# Altium footprint library Standard2.PcbLib: 423 footprints (part 14 of 27)
Each footprint in its own frame and in the unit in brackets; x right, y up, seen from the top. Pads: shape width x height; smd on the part's side, far side on the other; paste and mask are expansions set on the pad; w line width, h text height; cw(c..) or ccw(c..) is an arc to the next point about the centre after c.
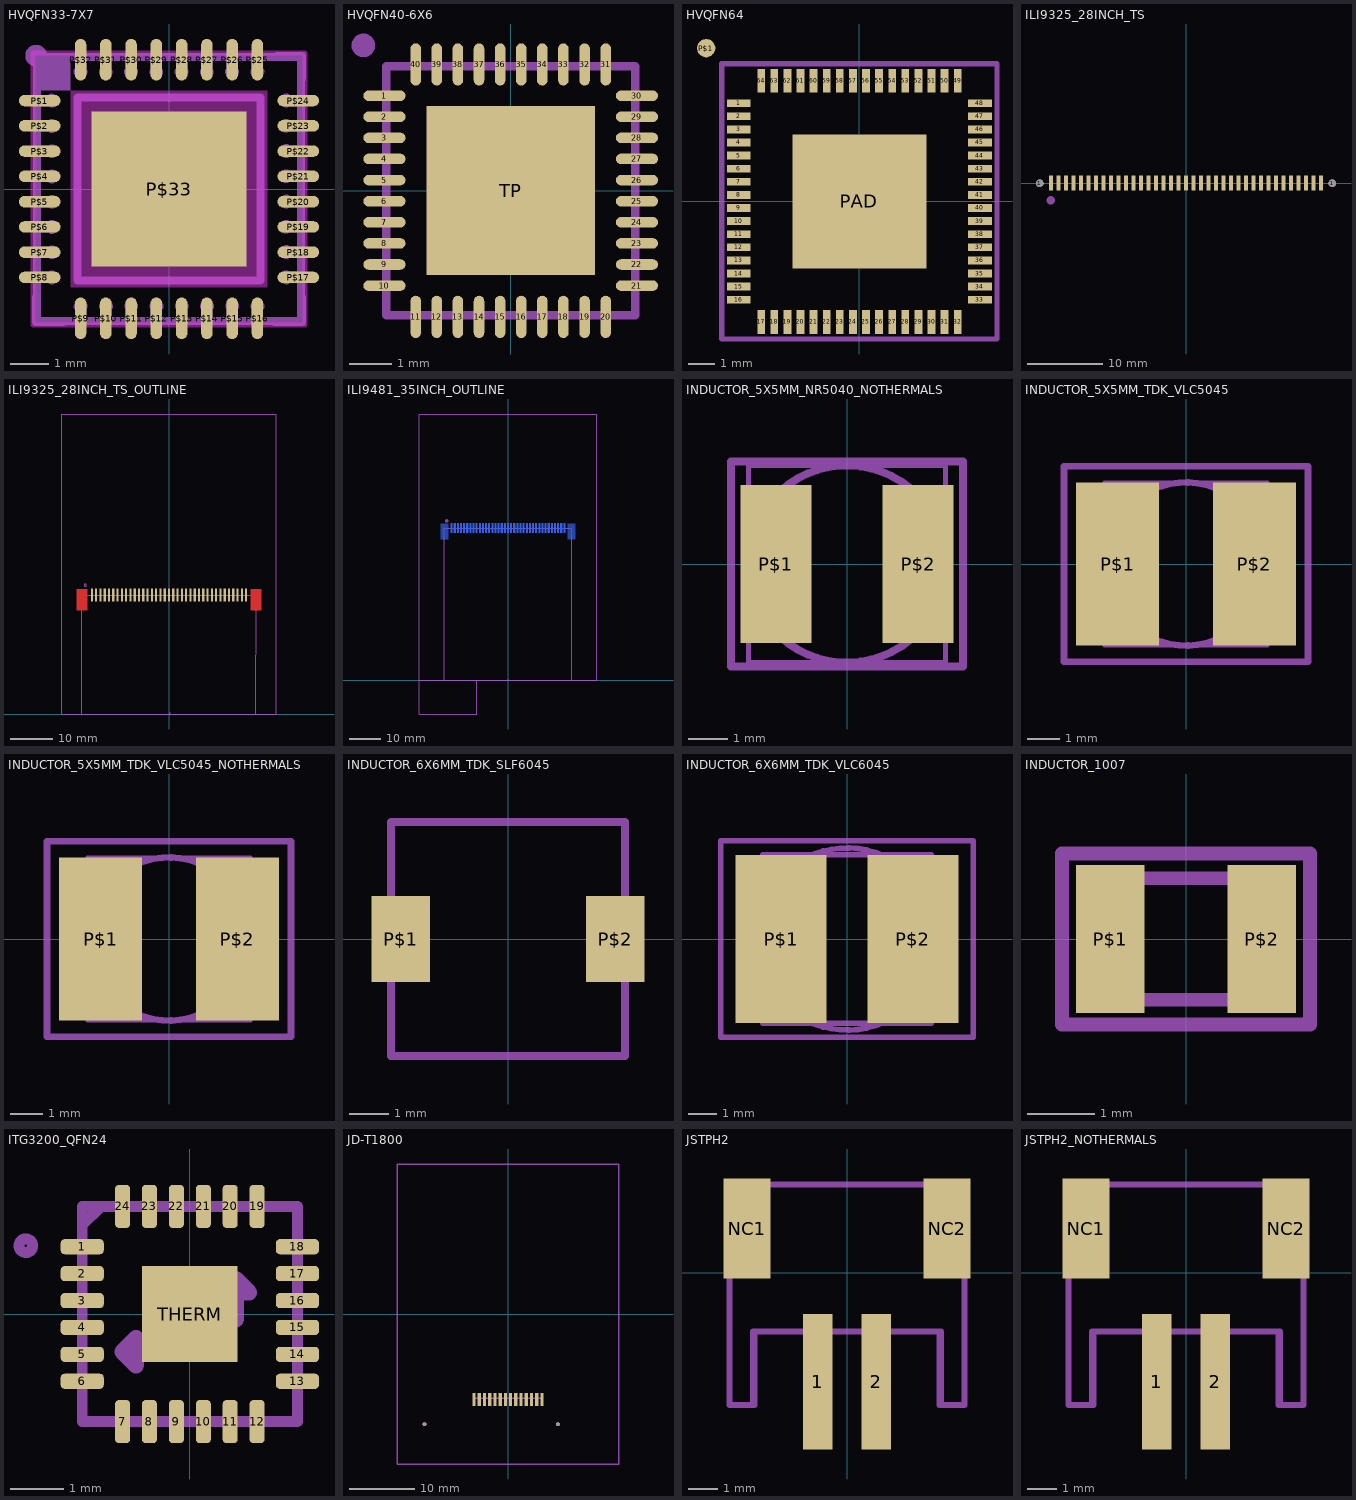
[diagram p13: the footprints below, top view; thin cyan lines are the x and y axes]

## HVQFN33-7X7 [mil]
pads (33):
  rrect100% 42x11.81 smd: P$1(-130.98,89.57) P$2(-130.98,63.98) P$3(-130.98,38.39) P$4(-130.98,12.8) P$5(-130.98,-12.8) P$6(-130.98,-38.39) P$7(-130.98,-63.98) P$8(-130.98,-89.57) P$17(130.98,-89.57) P$18(130.98,-63.98) P$19(130.98,-38.39) P$20(130.98,-12.8) P$21(130.98,12.8) P$22(130.98,38.39) P$23(130.98,63.98) P$24(130.98,89.57)
  rrect100% 11.81x42 smd: P$9(-89.57,-130.98) P$10(-63.98,-130.98) P$11(-38.39,-130.98) P$12(-12.8,-130.98) P$13(12.8,-130.98) P$14(38.39,-130.98) P$15(63.98,-130.98) P$16(89.57,-130.98) P$25(89.57,130.98) P$26(63.98,130.98) P$27(38.39,130.98) P$28(12.8,130.98) P$29(-12.8,130.98) P$30(-38.39,130.98) P$31(-63.98,130.98) P$32(-89.57,130.98)
  rect 157.48x157.48 smd paste-78.74: P$33(0,0)
Top Paste:
  rectangle: -68.9,29.53 -29.53,68.9
  rectangle: -19.69,29.53 19.69,68.9
  rectangle: 29.53,29.53 68.9,68.9
  rectangle: -68.9,-19.69 -29.53,19.69
  rectangle: -19.69,-19.69 19.69,19.69
  rectangle: 29.53,-19.69 68.9,19.69
  rectangle: -68.9,-68.9 -29.53,-29.53
  rectangle: -19.69,-68.9 19.69,-29.53
  rectangle: 29.53,-68.9 68.9,-29.53
Keep-Out Layer:
  rectangle: -100,-100 100,100
  lines w5: -137.8,-137.8 -137.8,137.8 137.8,137.8 137.8,-137.8 -137.8,-137.8
Mechanical 2:
  circle w12: c-134.59,135.12 r5
  lines w8: -135,-110 -135,-135 -107.5,-135 ; 107.5,-135 135,-135 135,-110 ; 110,135 135,135 135,112.5
Mechanical 18:
  rectangle: -135.83,100 -100,135.83
  region: -118.11,83.66 -118.11,95.47 -137.8,95.47 -137.8,83.66
  region: -118.11,58.07 -118.11,69.88 -137.8,69.88 -137.8,58.07
  region: -118.11,32.48 -118.11,44.29 -137.8,44.29 -137.8,32.48
  region: -118.11,6.89 -118.11,18.7 -137.8,18.7 -137.8,6.89
  region: -118.11,-18.7 -118.11,-6.89 -137.8,-6.89 -137.8,-18.7
  region: -118.11,-44.29 -118.11,-32.48 -137.8,-32.48 -137.8,-44.29
  region: -118.11,-69.88 -118.11,-58.07 -137.8,-58.07 -137.8,-69.88
  region: -118.11,-95.47 -118.11,-83.66 -137.8,-83.66 -137.8,-95.47
  region: -83.66,-118.11 -95.47,-118.11 -95.47,-137.8 -83.66,-137.8
  region: -58.07,-118.11 -69.88,-118.11 -69.88,-137.8 -58.07,-137.8
  region: -32.48,-118.11 -44.29,-118.11 -44.29,-137.8 -32.48,-137.8
  region: -6.89,-118.11 -18.7,-118.11 -18.7,-137.8 -6.89,-137.8
  region: 18.7,-118.11 6.89,-118.11 6.89,-137.8 18.7,-137.8
  region: 44.29,-118.11 32.48,-118.11 32.48,-137.8 44.29,-137.8
  region: 69.88,-118.11 58.07,-118.11 58.07,-137.8 69.88,-137.8
  region: 95.47,-118.11 83.66,-118.11 83.66,-137.8 95.47,-137.8
  region: 118.11,-83.66 118.11,-95.47 137.8,-95.47 137.8,-83.66
  region: 118.11,-58.07 118.11,-69.88 137.8,-69.88 137.8,-58.07
  region: 118.11,-32.48 118.11,-44.29 137.8,-44.29 137.8,-32.48
  region: 118.11,-6.89 118.11,-18.7 137.8,-18.7 137.8,-6.89
  region: 118.11,18.7 118.11,6.89 137.8,6.89 137.8,18.7
  region: 118.11,44.29 118.11,32.48 137.8,32.48 137.8,44.29
  region: 118.11,69.88 118.11,58.07 137.8,58.07 137.8,69.88
  region: 118.11,95.47 118.11,83.66 137.8,83.66 137.8,95.47
  rectangle: 83.66,118.11 95.47,137.8
  rectangle: 58.07,118.11 69.88,137.8
  rectangle: 32.48,118.11 44.29,137.8
  rectangle: 6.89,118.11 18.7,137.8
  rectangle: -18.7,118.11 -6.89,137.8
  rectangle: -44.29,118.11 -32.48,137.8
  rectangle: -69.88,118.11 -58.07,137.8
  rectangle: -95.47,118.11 -83.66,137.8
  lines w8: -119.29,-92.72 ccw(c-119.29,-89.67) -119.29,-86.61 ; -119.29,-67.13 ccw(c-119.29,-64.08) -119.29,-61.02 ; -119.29,-41.54 ccw(c-119.29,-38.48) -119.29,-35.43 ; -119.29,-15.94 ccw(c-119.29,-12.89) -119.29,-9.84 ; -119.29,9.65 ccw(c-119.29,12.7) -119.29,15.75 ; -119.29,35.24 ccw(c-119.29,38.29) -119.29,41.34 ; -119.29,60.83 ccw(c-119.29,63.88) -119.29,66.93 ; -119.29,86.42 ccw(c-119.29,89.47) -119.29,92.52 ; -92.72,119.29 ccw(c-89.67,119.29) -86.61,119.29 ; -92.52,-119.29 cw(c-89.47,-119.29) -86.42,-119.29 ; -67.13,119.29 ccw(c-64.08,119.29) -61.02,119.29 ; -66.93,-119.29 cw(c-63.88,-119.29) -60.83,-119.29 ; -41.54,119.29 ccw(c-38.48,119.29) -35.43,119.29 ; -41.34,-119.29 cw(c-38.29,-119.29) -35.24,-119.29 ; -15.94,119.29 ccw(c-12.89,119.29) -9.84,119.29 ; -15.75,-119.29 cw(c-12.7,-119.29) -9.65,-119.29 ; 9.65,119.29 ccw(c12.7,119.29) 15.75,119.29 ; 9.84,-119.29 cw(c12.89,-119.29) 15.94,-119.29 ; 35.24,119.29 ccw(c38.29,119.29) 41.34,119.29 ; 35.43,-119.29 cw(c38.48,-119.29) 41.54,-119.29 ; 60.83,119.29 ccw(c63.88,119.29) 66.93,119.29 ; 61.02,-119.29 cw(c64.08,-119.29) 67.13,-119.29 ; 86.42,119.29 ccw(c89.47,119.29) 92.52,119.29 ; 86.61,-119.29 cw(c89.67,-119.29) 92.72,-119.29 ; 119.29,-92.52 cw(c119.29,-89.47) 119.29,-86.42 ; 119.29,-66.93 cw(c119.29,-63.88) 119.29,-60.83 ; 119.29,-41.34 cw(c119.29,-38.29) 119.29,-35.24 ; 119.29,-15.75 cw(c119.29,-12.7) 119.29,-9.65 ; 119.29,9.84 cw(c119.29,12.89) 119.29,15.94 ; 119.29,35.43 cw(c119.29,38.48) 119.29,41.54 ; 119.29,61.02 cw(c119.29,64.08) 119.29,67.13 ; 119.29,86.61 cw(c119.29,89.67) 119.29,92.72 ; -133.86,-133.86 133.86,-133.86 133.86,133.86 -133.86,133.86 -133.86,-133.86 ; -92.52,-92.52 92.52,-92.52 92.52,92.52 -92.52,92.52 -92.52,-92.52

## HVQFN40-6X6 [mm]
pads (41):
  rrect100% 1x0.25 smd: 1(-2.99,2.25) 2(-2.99,1.75) 3(-2.99,1.25) 4(-2.99,0.75) 5(-2.99,0.25) 6(-2.99,-0.25) 7(-2.99,-0.75) 8(-2.99,-1.25) 9(-2.99,-1.75) 10(-2.99,-2.25) 21(2.99,-2.25) 22(2.99,-1.75) 23(2.99,-1.25) 24(2.99,-0.75) 25(2.99,-0.25) 26(2.99,0.25) 27(2.99,0.75) 28(2.99,1.25) 29(2.99,1.75) 30(2.99,2.25)
  rrect100% 0.25x1 smd: 11(-2.25,-2.99) 12(-1.75,-2.99) 13(-1.25,-2.99) 14(-0.75,-2.99) 15(-0.25,-2.99) 16(0.25,-2.99) 17(0.75,-2.99) 18(1.25,-2.99) 19(1.75,-2.99) 20(2.25,-2.99) 31(2.25,2.99) 32(1.75,2.99) 33(1.25,2.99) 34(0.75,2.99) 35(0.25,2.99) 36(-0.25,2.99) 37(-0.75,2.99) 38(-1.25,2.99) 39(-1.75,2.99) 40(-2.25,2.99)
  rect 4x4 smd paste-2: TP(0,0)
Top Paste:
  rectangle: -1.8,0.8 -0.8,1.8
  rectangle: -0.5,0.8 0.5,1.8
  rectangle: 0.8,0.8 1.8,1.8
  rectangle: -1.8,-0.5 -0.8,0.5
  rectangle: -1.8,-1.8 -0.8,-0.8
  rectangle: -0.5,-0.5 0.5,0.5
  rectangle: -0.5,-1.8 0.5,-0.8
  rectangle: 0.8,-1.8 1.8,-0.8
  rectangle: 0.8,-0.5 1.8,0.5
Mechanical 2:
  circle w0.305: c-3.49,3.44 r0.127
  lines w0.203: -2.95,-2.638 -2.95,-2.95 -2.638,-2.95 ; -2.95,2.638 -2.95,2.95 -2.638,2.95 ; 2.638,-2.95 2.95,-2.95 2.95,-2.638 ; 2.638,2.95 2.95,2.95 2.95,2.638
Mechanical 18:
  lines w0.203: -2.95,-2.95 -2.95,2.95 2.95,2.95 2.95,-2.95 -2.95,-2.95

## HVQFN64 [mm]
pads (66):
  rect 0.9x0.3 smd: 1(-4.6,3.75) 2(-4.6,3.25) 3(-4.6,2.75) 4(-4.6,2.25) 5(-4.6,1.75) 6(-4.6,1.25) 7(-4.6,0.75) 8(-4.6,0.25) 9(-4.6,-0.25) 10(-4.6,-0.75) 11(-4.6,-1.25) 12(-4.6,-1.75) 13(-4.6,-2.25) 14(-4.6,-2.75) 15(-4.6,-3.25) 16(-4.6,-3.75) 33(4.6,-3.75) 34(4.6,-3.25) 35(4.6,-2.75) 36(4.6,-2.25) 37(4.6,-1.75) 38(4.6,-1.25) 39(4.6,-0.75) 40(4.6,-0.25) 41(4.6,0.25) 42(4.6,0.75) 43(4.6,1.25) 44(4.6,1.75) 45(4.6,2.25) 46(4.6,2.75) 47(4.6,3.25) 48(4.6,3.75)
  rect 0.3x0.9 smd: 17(-3.75,-4.6) 18(-3.25,-4.6) 19(-2.75,-4.6) 20(-2.25,-4.6) 21(-1.75,-4.6) 22(-1.25,-4.6) 23(-0.75,-4.6) 24(-0.25,-4.6) 25(0.25,-4.6) 26(0.75,-4.6) 27(1.25,-4.6) 28(1.75,-4.6) 29(2.25,-4.6) 30(2.75,-4.6) 31(3.25,-4.6) 32(3.75,-4.6) 49(3.75,4.6) 50(3.25,4.6) 51(2.75,4.6) 52(2.25,4.6) 53(1.75,4.6) 54(1.25,4.6) 55(0.75,4.6) 56(0.25,4.6) 57(-0.25,4.6) 58(-0.75,4.6) 59(-1.25,4.6) 60(-1.75,4.6) 61(-2.25,4.6) 62(-2.75,4.6) 63(-3.25,4.6) 64(-3.75,4.6)
  rrect100% 0.7x0.7 smd paste-0.35: P$1(-5.85,5.85)
  rect 5.1x5.1 smd: PAD(0,0)
Mechanical 2:
  lines w0.203: -5.25,-5.25 5.25,-5.25 5.25,5.25 -5.25,5.25 -5.25,-5.25

## ILI9325_28INCH_TS [mm]
pads (39):
  round 1 hole 1: 1(-19.5,0) 1(19.5,0)
  rect 0.5x2 smd: 1(-18,0) 2(-17,0) 3(-16,0) 4(-15,0) 5(-14,0) 6(-13,0) 7(-12,0) 8(-11,0) 9(-10,0) 10(-9,0) 11(-8,0) 12(-7,0) 13(-6,0) 14(-5,0) 15(-4,0) 16(-3,0) 17(-2,0) 18(-1,0) 19(0,0) 20(1,0) 21(2,0) 22(3,0) 23(4,0) 24(5,0) 25(6,0) 26(7,0) 27(8,0) 28(9,0) 29(10,0) 30(11,0) 31(12,0) 32(13,0) 33(14,0) 34(15,0) 35(16,0) 36(17,0) 37(18,0)
Mechanical 2:
  circle w0.61: c-18.034,-2.286 r0.254
Mechanical 12:
  region: 0,0 0.254,0 0.254,0.254 0,0.254
  region: 0,0 0.254,0 0.254,0.254 0,0.254

## ILI9325_28INCH_TS_OUTLINE [mm]
pads (37):
  rect 0.5x3 smd: 1(-18,27.77) 2(-17,27.77) 3(-16,27.77) 4(-15,27.77) 5(-14,27.77) 6(-13,27.77) 7(-12,27.77) 8(-11,27.77) 9(-10,27.77) 10(-9,27.77) 11(-8,27.77) 12(-7,27.77) 13(-6,27.77) 14(-5,27.77) 15(-4,27.77) 16(-3,27.77) 17(-2,27.77) 18(-1,27.77) 19(0,27.77) 20(1,27.77) 21(2,27.77) 22(3,27.77) 23(4,27.77) 24(5,27.77) 25(6,27.77) 26(7,27.77) 27(8,27.77) 28(9,27.77) 29(10,27.77) 30(11,27.77) 31(12,27.77) 32(13,27.77) 33(14,27.77) 34(15,27.77) 35(16,27.77) 36(17,27.77) 37(18,27.77)
Top Layer:
  rectangle: -21.59,24.13 -19.05,29.21
  rectangle: 19.05,24.13 21.59,29.21
Top Solder:
  rectangle: -21.59,24.13 -19.05,29.21
  rectangle: 19.05,24.13 21.59,29.21
Mechanical 2:
  circle w0.203: c-19.534,30.054 r0.254
  lines w0.203: -25,0 -25,70 25,70 25,0 20.3,0 -20.4,0 -25,0
Mechanical 12:
  region: 0,0 0.254,0 0.254,0.254 0,0.254
  region: 0,0 0.254,0 0.254,0.254 0,0.254
  region: 0,0 0.254,0 0.254,0.254 0,0.254
  region: 0,0 0.254,0 0.254,0.254 0,0.254
Mechanical 18:
  lines w0.127: -25,0 -20.4,0 20.3,0 25,0 25,70 -25,70 -25,0
  lines w0.203: -20.4,0 -20.4,27.686 20.4,27.686 20.3,0

## ILI9481_35INCH_OUTLINE [mm]
pads (37):
  rect 0.5x3 smd far side: 1(-18,48.57) 2(-17,48.57) 3(-16,48.57) 4(-15,48.57) 5(-14,48.57) 6(-13,48.57) 7(-12,48.57) 8(-11,48.57) 9(-10,48.57) 10(-9,48.57) 11(-8,48.57) 12(-7,48.57) 13(-6,48.57) 14(-5,48.57) 15(-4,48.57) 16(-3,48.57) 17(-2,48.57) 18(-1,48.57) 19(0,48.57) 20(1,48.57) 21(2,48.57) 22(3,48.57) 23(4,48.57) 24(5,48.57) 25(6,48.57) 26(7,48.57) 27(8,48.57) 28(9,48.57) 29(10,48.57) 30(11,48.57) 31(12,48.57) 32(13,48.57) 33(14,48.57) 34(15,48.57) 35(16,48.57) 36(17,48.57) 37(18,48.57)
Bottom Layer:
  rectangle: -21.59,44.93 -19.05,50.01
  rectangle: 19.05,44.93 21.59,50.01
Bottom Solder:
  rectangle: -21.59,44.93 -19.05,50.01
  rectangle: 19.05,44.93 21.59,50.01
Mechanical 2:
  circle w0.61: c-19.534,50.854 r0.254
Mechanical 12:
  region: 0,0 0.254,0 0.254,0.254 0,0.254
  region: 0,0 0.254,0 0.254,0.254 0,0.254
  region: 0,0 0.254,0 0.254,0.254 0,0.254
  region: 0,0 0.254,0 0.254,0.254 0,0.254
Mechanical 19:
  lines w0.127: -10,0 -10,-10.75 -28.27,-10.75 -28.27,0 ; -28.27,0 -20.4,0 ; -28.27,0 -28.27,85 28.27,85 28.27,0 20.4,0 ; -20.4,0 -20.4,48.486 20.4,48.486 20.4,0 ; -20.4,0 20.4,0

## INDUCTOR_5X5MM_NR5040_NOTHERMALS [mm]
pads (2):
  rect 1.8x4 smd: P$1(-1.8,0) P$2(1.8,0)
Mechanical 2:
  lines w0.203: -2.938,-2.6 2.938,-2.6 2.938,2.6 -2.938,2.6 -2.938,-2.6
Mechanical 18:
  circle w0.203: c0,0 r2.5
  lines w0.127: -2.5,-2.5 2.5,-2.5 2.5,2.5 -2.5,2.5 -2.5,-2.5

## INDUCTOR_5X5MM_TDK_VLC5045 [mm]
pads (2):
  rect 2.54x5 smd: P$1(-2.096,0) P$2(2.096,0)
Mechanical 2:
  lines w0.203: -3.738,-3 3.738,-3 3.738,3 -3.738,3 -3.738,-3
Mechanical 18:
  circle w0.203: c0,0 r2.5
  lines w0.127: -2.5,-2.5 2.5,-2.5 2.5,2.5 -2.5,2.5 -2.5,-2.5

## INDUCTOR_5X5MM_TDK_VLC5045_NOTHERMALS [mm]
pads (2):
  rect 2.54x5 smd: P$1(-2.096,0) P$2(2.096,0)
Mechanical 2:
  lines w0.203: -3.738,-3 -3.738,3 3.738,3 3.738,-3 -3.738,-3
Mechanical 18:
  circle w0.203: c0,0 r2.5
  lines w0.127: -2.5,-2.5 -2.5,2.5 2.5,2.5 2.5,-2.5 -2.5,-2.5

## INDUCTOR_6X6MM_TDK_SLF6045 [mm]
pads (2):
  rect 1.5x2.2 smd: P$1(-2.75,0) P$2(2.75,0)
Mechanical 2:
  lines w0.203: -3,-2 -3,-3 3,-3 3,-2 ; -3,2 -3,3 3,3 3,2
Mechanical 18:
  lines w0.127: -3,-3 3,-3 ; -3,3 3,3
  lines w0.203: -3,-3 -3,3 ; 3,-3 3,3

## INDUCTOR_6X6MM_TDK_VLC6045 [mm]
pads (2):
  rect 3.25x6 smd: P$1(-2.35,0) P$2(2.35,0)
Mechanical 2:
  lines w0.203: -4.5,-3.5 4.5,-3.5 4.5,3.5 -4.5,3.5 -4.5,-3.5
Mechanical 18:
  circle w0.203: c0,0 r3.25
  lines w0.203: -3,-3 3,-3 3,3 -3,3 -3,-3

## INDUCTOR_1007 [mil]
pads (2):
  rect 40x86.61 smd: P$1(-44.37,0) P$2(44.37,0)
Mechanical 2:
  lines w8: -72.5,-50 72.5,-50 72.5,50 -72.5,50 -72.5,-50
Mechanical 18:
  lines w8: -29.53,-35.43 -49.21,-35.43 -49.21,35.43 -29.53,35.43 ; -29.53,-35.43 29.53,-35.43 ; -29.53,-35.43 -29.53,35.43 ; -29.53,35.43 29.53,35.43 ; 29.53,-35.43 49.21,-35.43 49.21,35.43 29.53,35.43 ; 29.53,-35.43 29.53,35.43

## ITG3200_QFN24 [mil]
pads (25):
  rrect50% 31.5x11.02 smd: 1(-78.74,49.21) 2(-78.74,29.53) 3(-78.74,9.84) 4(-78.74,-9.84) 5(-78.74,-29.53) 6(-78.74,-49.21) 13(78.74,-49.21) 14(78.74,-29.53) 15(78.74,-9.84) 16(78.74,9.84) 17(78.74,29.53) 18(78.74,49.21)
  rrect50% 11.02x31.5 smd: 7(-49.21,-78.74) 8(-29.53,-78.74) 9(-9.84,-78.74) 10(9.84,-78.74) 11(29.53,-78.74) 12(49.21,-78.74) 19(49.21,78.74) 20(29.53,78.74) 21(9.84,78.74) 22(-9.84,78.74) 23(-29.53,78.74) 24(-49.21,78.74)
  rect 70x70 smd paste-35: THERM(0,0)
Top Paste:
  rectangle: 3.94,3.94 29.53,29.53
  rectangle: 3.94,-29.53 29.53,-3.94
  rectangle: -29.53,3.94 -3.94,29.53
  rectangle: -29.53,-29.53 -3.94,-3.94
Mechanical 2:
  circle w8: c-120,50 r5
  lines w8: -78.74,-64.96 -78.74,-78.74 -64.96,-78.74 ; -78.74,64.96 -64.96,78.74 ; 64.96,-78.74 78.74,-78.74 78.74,-64.96 ; 64.96,78.74 78.74,78.74 78.74,64.96
Mechanical 18:
  circle w8: c-12.06,11.75 r15.75
  circle w8: c-12.06,12.75 r1
  lines w8: -78.74,-78.74 -78.74,78.74 78.74,78.74 78.74,-78.74 -78.74,-78.74
  lines w12: -19.69,-27.56 -49.21,-27.56 ; 33.46,-3.94 33.46,25.59 ; -49.21,-27.56 -39.37,-37.4 -39.37,-17.72 -49.21,-27.56 ; 33.46,25.59 23.62,15.75 43.31,15.75 33.46,25.59

## JD-T1800 [mm]
pads (16):
  round 0.6 hole 0.6: 1(-12.8,-16.9) 1(7.65,-16.9)
  rect 0.5x2 smd: 1(5.2,-13.1) 2(4.4,-13.1) 3(3.6,-13.1) 4(2.8,-13.1) 5(2,-13.1) 6(1.2,-13.1) 7(0.4,-13.1) 8(-0.4,-13.1) 9(-1.2,-13.1) 10(-2,-13.1) 11(-2.8,-13.1) 12(-3.6,-13.1) 13(-4.4,-13.1) 14(-5.2,-13.1)
Mechanical 2:
  lines w0.203: -5.2,-12.9 5.2,-12.9 ; -17,-23 -17,23 17,23 17,-23 -17,-23

## JSTPH2 [mm]
pads (4):
  rect 1x4.6 smd: 1(-1,-3.7) 2(1,-3.7)
  rect 1.6x3.4 smd: NC1(-3.4,1.5) NC2(3.4,1.5)
Mechanical 2:
  lines w0.203: -4,-0.5 -4,-4.5 -3.15,-4.5 -3.15,-2 -1.75,-2 ; -2.25,3 2.25,3 ; 1.75,-2 3.15,-2 3.15,-4.5 4,-4.5 4,-0.5
Mechanical 18:
  lines w0.203: -4,-4.5 -3.2,-4.5 -3.2,-2 3.2,-2 3.2,-4.5 4,-4.5 4,3 -4,3 -4,-4.5

## JSTPH2_NOTHERMALS [mm]
pads (4):
  rect 1x4.6 smd: 1(-1,-3.7) 2(1,-3.7)
  rect 1.6x3.4 smd: NC1(-3.4,1.5) NC2(3.4,1.5)
Mechanical 2:
  lines w0.203: -4,-0.5 -4,-4.5 -3.15,-4.5 -3.15,-2 -1.75,-2 ; -2.25,3 2.25,3 ; 1.75,-2 3.15,-2 3.15,-4.5 4,-4.5 4,-0.5
Mechanical 18:
  lines w0.203: -4,-4.5 -4,3 4,3 4,-4.5 3.2,-4.5 3.2,-2 -3.2,-2 -3.2,-4.5 -4,-4.5